# Altium footprint library LEMO THD.PcbLib: 54 footprints (part 2 of 4)
Each footprint in its own frame and in the unit in brackets; x right, y up, seen from the top. Pads: shape width x height; smd on the part's side, far side on the other; paste and mask are expansions set on the pad; w line width, h text height; cw(c..) or ccw(c..) is an arc to the next point about the centre after c.
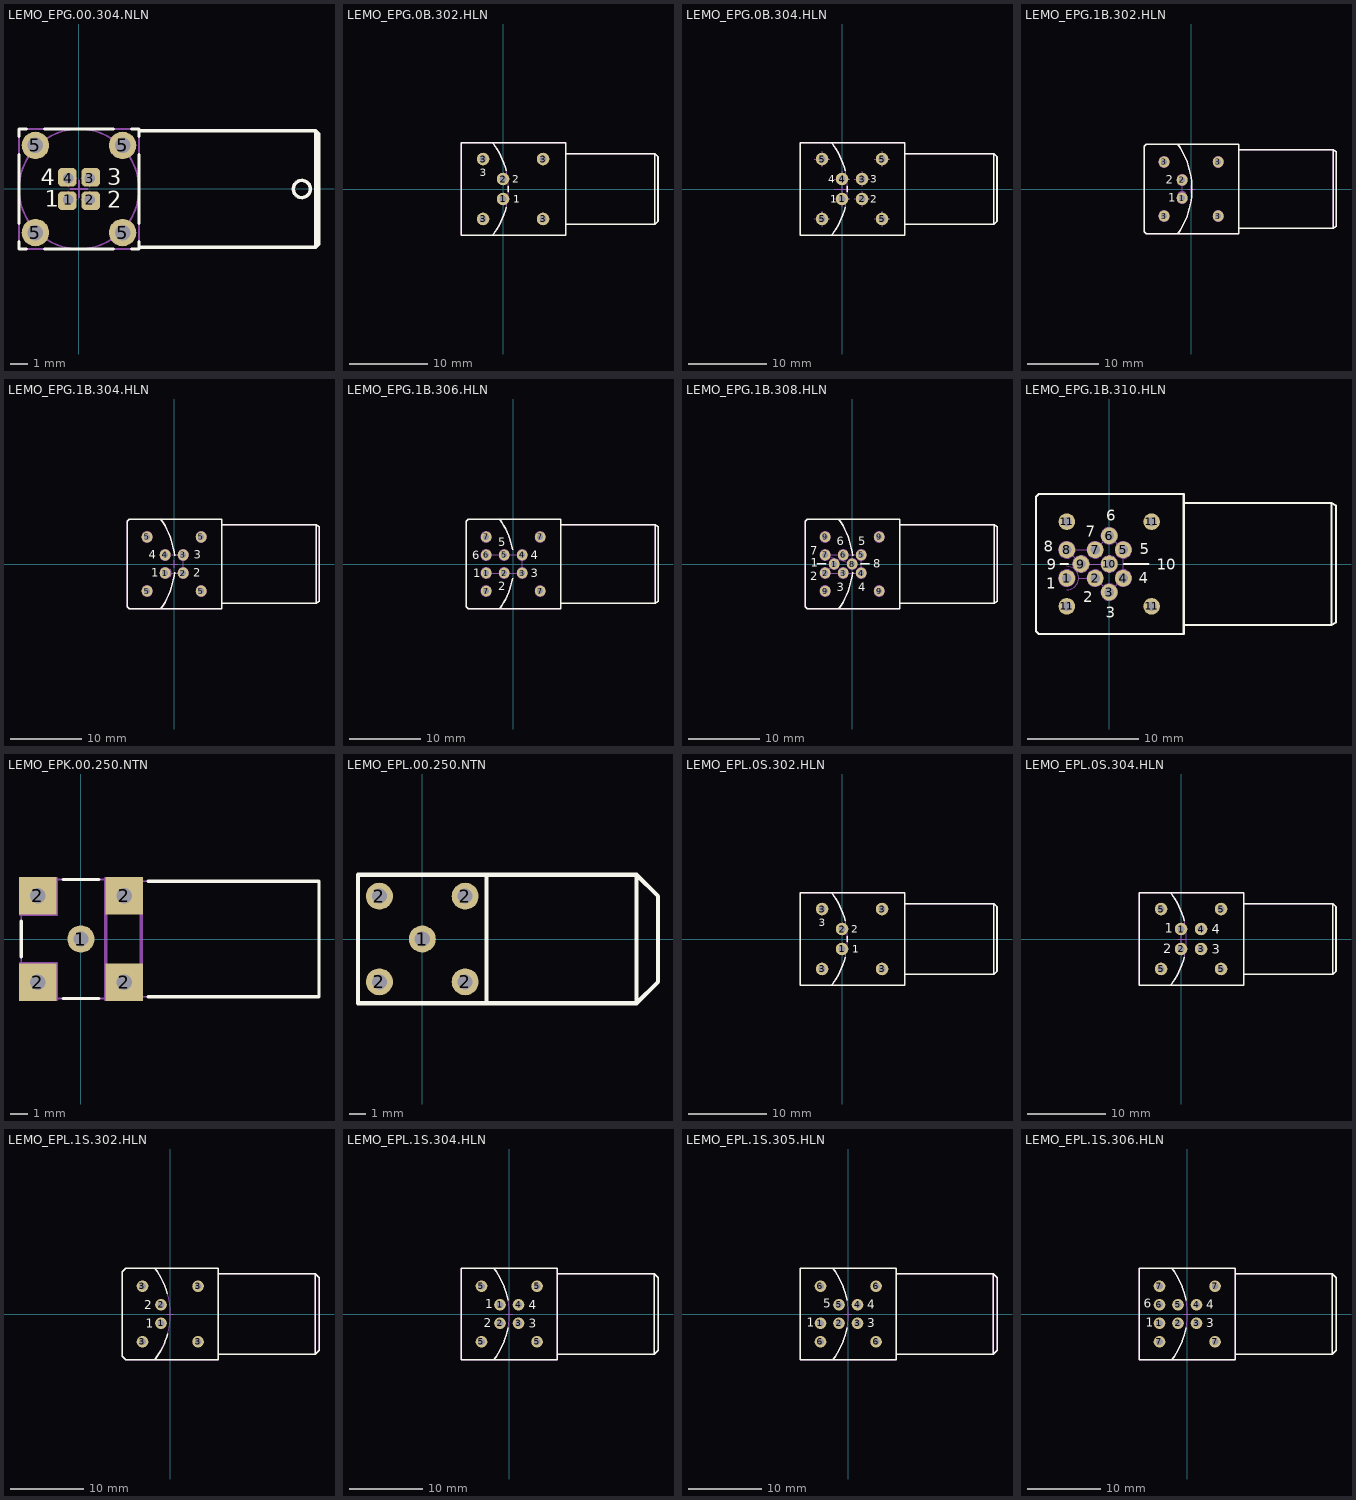
[diagram p1: the footprints below, top view; thin cyan lines are the x and y axes]

## LEMO_EPG.00.304.NLN [mm] "Multipole 4 Contacts, 50 Ohm size 00 Coaxial Elbow (90°) Socket With Key"
height 7
pads (8):
  rrect50% 1.1x1.1 hole 0.6 copper offset -0.05,-0.05: 1(-0.635,-0.635)
  rrect50% 1.1x1.1 hole 0.6 copper offset 0.05,-0.05: 2(0.635,-0.635)
  rrect50% 1.1x1.1 hole 0.6 copper offset 0.05,0.05: 3(0.635,0.635)
  rrect50% 1.1x1.1 hole 0.6 copper offset -0.05,0.05: 4(-0.635,0.635)
  round 1.6 hole 0.9: 5(-2.54,-2.54) 5(-2.54,2.54) 5(2.54,-2.54) 5(2.54,2.54)
Top Overlay:
  circle w0.2: c13,0 r0.5
  lines w0.2: -3.5,-3.077 -3.5,-3.5 -3.077,-3.5 ; -3.5,-2.003 -3.5,2.003 ; -3.5,3.077 -3.5,3.5 -3.077,3.5 ; -2.003,-3.5 2.003,-3.5 ; -2.003,3.5 2.003,3.5 ; 3.077,-3.5 3.5,-3.5 3.5,-3.077 ; 3.077,3.5 3.5,3.5 3.5,3.077 ; 3.5,-3.4 13.8,-3.4 ; 3.5,-2.003 3.5,2.003 ; 3.5,3.399 13.8,3.4 ; 13.8,-3.4 14,-3.2 14,3.2 13.8,3.4 ; 13.8,-3.4 13.8,3.4
  text "1" at -2.007,-1.048 h0.97
  text "4" at -2.231,0.232 h0.97
  text "3" at 1.652,0.208 h0.97
  text "2" at 1.648,-1.108 h0.97
Mechanical 8:
  lines w0.1: -3.04,-2.54 -2.54,-2.54 ; -3.04,2.54 -2.54,2.54 ; -2.54,-3.04 -2.54,-2.54 ; -2.54,-2.04 -2.54,-2.54 ; -2.54,2.04 -2.54,2.54 ; -2.54,3.04 -2.54,2.54 ; -2.04,-2.54 -2.54,-2.54 ; -2.04,2.54 -2.54,2.54 ; -1.135,-0.635 -0.635,-0.635 ; -1.135,0.635 -0.635,0.635 ; -0.635,-1.135 -0.635,-0.635 ; -0.635,-0.135 -0.635,-0.635 ; -0.635,0.135 -0.635,0.635 ; -0.635,1.135 -0.635,0.635 ; -0.5,0 0,0 ; -0.135,-0.635 -0.635,-0.635 ; -0.135,0.635 -0.635,0.635 ; 0,-0.5 0,0 ; 0,0.5 0,0 ; 0.135,-0.635 0.635,-0.635 ; 0.135,0.635 0.635,0.635 ; 0.5,0 0,0 ; 0.635,-1.135 0.635,-0.635 ; 0.635,-0.135 0.635,-0.635 ; 0.635,0.135 0.635,0.635 ; 0.635,1.135 0.635,0.635 ; 1.135,-0.635 0.635,-0.635 ; 1.135,0.635 0.635,0.635 ; 2.04,-2.54 2.54,-2.54 ; 2.04,2.54 2.54,2.54 ; 2.54,-3.04 2.54,-2.54 ; 2.54,-2.04 2.54,-2.54 ; 2.54,2.04 2.54,2.54 ; 2.54,3.04 2.54,2.54 ; 3.04,-2.54 2.54,-2.54 ; 3.04,2.54 2.54,2.54
Mechanical 14:
  circle w0.1: c0,0 r3.5
  circle w0.1: c13,0 r0.5
  lines w0.1: 3.5,-3.4 13.8,-3.4 ; 3.5,3.399 13.8,3.4 ; 13.8,-3.4 14,-3.2 14,3.2 13.8,3.4 ; 13.8,-3.4 13.8,3.4 ; -3.5,-3.5 3.5,-3.5 3.5,3.5 -3.5,3.5 -3.5,-3.5
  text "1" at -2.007,-1.048 h0.97
  text "4" at -2.231,0.232 h0.97
  text "3" at 1.652,0.208 h0.97
  text "2" at 1.648,-1.108 h0.97
3D body "LEMO_EPG.00.304.NLN.stp": height 7, standoff -3, extent -3.5,-3.5 14,3.5

## LEMO_EPG.0B.302.HLN [mm] "Elbow Receptacle (90°) With 2 Female Contacts and Key (G) For PCB"
height 12.7
pads (6):
  round 1.6 hole 0.9: 1(0,-1.27) 2(0,1.27) 3(-2.54,-3.81) 3(-2.54,3.81) 3(5.08,-3.81) 3(5.08,3.81)
Top Overlay:
  lines w0.2: -1.32,-5.85 ccw(c-8.876,0) 0.386,-2.353 ; -1.32,5.85 cw(c-8.876,0) 0.386,2.353 ; 0.674,-0.338 ccw(c-8.876,0) 0.674,0.338 ; 7.98,-4.5 19.28,-4.5 ; 7.98,4.5 19.28,4.5 ; 19.28,-4.5 19.68,-4.1 19.68,4.1 19.28,4.5 ; 19.28,-4.5 19.28,4.5 ; -5.32,-5.85 -5.32,5.85 7.98,5.85 7.98,-5.85 -5.32,-5.85
  text "3" at -2.975,1.625 h0.97
  text "2" at 1.186,0.787 h0.97
  text "1" at 1.275,-1.75 h0.97
Mechanical 14:
  circle w0.1: c0,1.27 r0.4
  circle w0.1: c0,-1.27 r0.4
  circle w0.1: c-2.54,-3.81 r0.4
  circle w0.1: c5.08,-3.81 r0.4
  circle w0.1: c5.08,3.81 r0.4
  circle w0.1: c-2.54,3.81 r0.4
  lines w0.1: -1.32,-5.85 ccw(c-8.876,0) -1.32,5.85 ; 7.98,-4.5 19.28,-4.5 ; 7.98,4.5 19.28,4.5 ; 19.28,-4.5 19.68,-4.1 19.68,4.1 19.28,4.5 ; 19.28,-4.5 19.28,4.5 ; -5.32,-5.85 -5.32,5.85 7.98,5.85 7.98,-5.85 -5.32,-5.85
  text "3" at -2.975,1.625 h0.97
  text "2" at 1.186,0.787 h0.97
  text "1" at 1.275,-1.75 h0.97
3D body "LEMO_EPG.0B.302.HLN.stp": height 12.7, standoff -4, extent -5.32,-5.85 19.68,5.85

## LEMO_EPG.0B.304.HLN [mm] "Elbow Receptacle (90°) With 4 Female Contacts and Key (G) For PCB"
height 12.7
pads (8):
  round 1.6 hole 0.9: 1(0,-1.27) 2(2.54,-1.27) 3(2.54,1.27) 4(0,1.27) 5(-2.54,-3.81) 5(-2.54,3.81) 5(5.08,-3.81) 5(5.08,3.81)
Top Overlay:
  lines w0.2: -1.32,-5.85 ccw(c-8.876,0) 0.386,-2.353 ; -1.32,5.85 cw(c-8.876,0) 0.386,2.353 ; 0.674,-0.338 ccw(c-8.876,0) 0.674,0.338 ; 7.98,-4.5 19.28,-4.5 ; 7.98,4.5 19.28,4.5 ; 19.28,-4.5 19.28,4.5 ; 19.28,-4.5 19.68,-4.1 19.68,4.1 19.28,4.5 ; -5.32,-5.85 7.98,-5.85 7.98,5.85 -5.32,5.85 -5.32,-5.85
  text "4" at -1.773,0.79 h0.97
  text "3" at 3.599,0.787 h0.97
  text "1" at -1.519,-1.75 h0.97
  text "2" at 3.599,-1.753 h0.97
Mechanical 8:
  lines w0.1: -3.54,-3.81 -2.54,-3.81 ; -3.54,3.81 -2.54,3.81 ; -2.54,-4.81 -2.54,-3.81 ; -2.54,-2.81 -2.54,-3.81 ; -2.54,2.81 -2.54,3.81 ; -2.54,4.81 -2.54,3.81 ; -1.54,-3.81 -2.54,-3.81 ; -1.54,3.81 -2.54,3.81 ; -1,-1.27 0,-1.27 ; -1,0 0,0 ; -1,1.27 0,1.27 ; 0,-2.27 0,-1.27 ; 0,-1 0,0 ; 0,-0.27 0,-1.27 ; 0,0.27 0,1.27 ; 0,1 0,0 ; 0,2.27 0,1.27 ; 1,-1.27 0,-1.27 ; 1,0 0,0 ; 1,1.27 0,1.27 ; 1.54,-1.27 2.54,-1.27 ; 1.54,1.27 2.54,1.27 ; 2.54,-2.27 2.54,-1.27 ; 2.54,-0.27 2.54,-1.27 ; 2.54,0.27 2.54,1.27 ; 2.54,2.27 2.54,1.27 ; 3.54,-1.27 2.54,-1.27 ; 3.54,1.27 2.54,1.27 ; 4.08,-3.81 5.08,-3.81 ; 4.08,3.81 5.08,3.81 ; 5.08,-4.81 5.08,-3.81 ; 5.08,-2.81 5.08,-3.81 ; 5.08,2.81 5.08,3.81 ; 5.08,4.81 5.08,3.81 ; 6.08,-3.81 5.08,-3.81 ; 6.08,3.81 5.08,3.81
Mechanical 14:
  circle w0.1: c-2.54,3.81 r0.4
  circle w0.1: c5.08,3.81 r0.4
  circle w0.1: c5.08,-3.81 r0.4
  circle w0.1: c-2.54,-3.81 r0.4
  circle w0.1: c0,-1.27 r0.4
  circle w0.1: c0,1.27 r0.4
  circle w0.1: c2.54,1.27 r0.4
  circle w0.1: c2.54,-1.27 r0.4
  lines w0.1: -1.32,-5.85 ccw(c-8.876,0) -1.32,5.85 ; 7.98,-4.5 19.28,-4.5 ; 7.98,4.5 19.28,4.5 ; 19.28,-4.5 19.28,4.5 ; 19.28,-4.5 19.68,-4.1 19.68,4.1 19.28,4.5 ; -5.32,-5.85 7.98,-5.85 7.98,5.85 -5.32,5.85 -5.32,-5.85
  text "4" at -1.773,0.79 h0.97
  text "3" at 3.599,0.787 h0.97
  text "1" at -1.519,-1.75 h0.97
  text "2" at 3.599,-1.753 h0.97
3D body "LEMO_EPG.0B.304.HLN.stp": height 12.7, standoff -4, extent -5.32,-5.85 19.68,5.85

## LEMO_EPG.1B.302.HLN [mm] "Elbow Receptacle (90°) With 2 Female Contacts and Key For PCB"
height 14
pads (6):
  round 1.55 hole 0.85: 1(-1.27,-1.27) 2(-1.27,1.27) 3(-3.81,-3.81) 3(-3.81,3.81) 3(3.81,-3.81) 3(3.81,3.81)
Top Overlay:
  lines w0.2: -1.875,-6.3 ccw(c-10.879,0) -1.875,6.3 ; 6.71,-5.5 20.01,-5.5 ; 6.71,5.5 20.01,5.5 ; 20.01,-5.5 20.41,-5.26 20.41,5.26 20.01,5.5 ; 20.01,-5.5 20.01,5.5 ; -6.59,-6.05 -6.59,6.05 -6.34,6.3 6.71,6.3 6.71,-6.3 -6.34,-6.3 -6.59,-6.05
  text "1" at -3.237,-1.788 h1.2
  text "2" at -3.577,0.712 h1.2
Mechanical 8:
  circle w0.1: c3.81,3.81 r0.75
  circle w0.1: c3.81,-3.81 r0.75
  circle w0.1: c-3.81,-3.81 r0.75
  circle w0.1: c-1.27,-1.27 r0.75
  circle w0.1: c-1.27,1.27 r0.75
  circle w0.1: c-3.81,3.81 r0.75
  lines w0.1: -4.31,-3.81 -3.81,-3.81 ; -4.31,3.81 -3.81,3.81 ; -3.81,-4.31 -3.81,-3.81 ; -3.81,-3.31 -3.81,-3.81 ; -3.81,3.31 -3.81,3.81 ; -3.81,4.31 -3.81,3.81 ; -3.31,-3.81 -3.81,-3.81 ; -3.31,3.81 -3.81,3.81 ; -1.77,-1.27 -1.27,-1.27 ; -1.77,1.27 -1.27,1.27 ; -1.27,-1.77 -1.27,-1.27 ; -1.27,-0.77 -1.27,-1.27 ; -1.27,0.77 -1.27,1.27 ; -1.27,1.77 -1.27,1.27 ; -0.77,-1.27 -1.27,-1.27 ; -0.77,1.27 -1.27,1.27 ; -0.5,0 0,0 ; 0,-0.5 0,0 ; 0,0.5 0,0 ; 0.5,0 0,0 ; 3.31,-3.81 3.81,-3.81 ; 3.31,3.81 3.81,3.81 ; 3.81,-4.31 3.81,-3.81 ; 3.81,-3.31 3.81,-3.81 ; 3.81,3.31 3.81,3.81 ; 3.81,4.31 3.81,3.81 ; 4.31,-3.81 3.81,-3.81 ; 4.31,3.81 3.81,3.81
Mechanical 14:
  lines w0.1: -1.875,-6.3 ccw(c-10.879,0) -1.875,6.3 ; -1.8,-0.591 cw(c-1.27,-1.121) -0.74,-0.591 ; -1.27,-0.371 -1.27,0.52 ; 6.71,-5.5 20.01,-5.5 ; 6.71,5.5 20.01,5.5 ; 20.01,-5.5 20.41,-5.26 20.41,5.26 20.01,5.5 ; 20.01,-5.5 20.01,5.5 ; -6.59,-6.05 -6.59,6.05 -6.34,6.3 6.71,6.3 6.71,-6.3 -6.34,-6.3 -6.59,-6.05
  text "1" at -3.237,-1.788 h1.2
  text "2" at -3.577,0.712 h1.2
3D body "LEMO_EPG.1B.302.HLN.stp": height 14, standoff -3.2, extent -6.59,-6.3 20.41,6.3

## LEMO_EPG.1B.304.HLN [mm] "Elbow Receptacle (90°) With 4 Female Contacts and Key For PCB"
height 14
pads (8):
  round 1.55 hole 0.85: 1(-1.27,-1.27) 2(1.27,-1.27) 3(1.27,1.27) 4(-1.27,1.27) 5(-3.81,-3.81) 5(-3.81,3.81) 5(3.81,-3.81) 5(3.81,3.81)
Top Overlay:
  lines w0.2: -1.875,-6.3 ccw(c-10.879,0) 0.05,-1.149 ; -1.875,6.3 cw(c-10.879,0) 0.05,1.149 ; 6.71,-5.5 20.01,-5.5 ; 6.71,5.5 20.01,5.5 ; 20.01,-5.5 20.01,5.5 ; 20.01,-5.5 20.41,-5.26 20.41,5.26 20.01,5.5 ; -6.59,-6.05 -6.34,-6.3 6.71,-6.3 6.71,6.3 -6.34,6.3 -6.59,6.05 -6.59,-6.05
  text "4" at -3.577,0.712 h1.2
  text "3" at 2.783,0.712 h1.2
  text "2" at 2.688,-1.788 h1.2
  text "1" at -3.237,-1.788 h1.2
Mechanical 8:
  circle w0.1: c-3.81,3.81 r0.75
  circle w0.1: c-1.27,1.27 r0.75
  circle w0.1: c1.27,1.27 r0.75
  circle w0.1: c1.27,-1.27 r0.75
  circle w0.1: c-1.27,-1.27 r0.75
  circle w0.1: c-3.81,-3.81 r0.75
  circle w0.1: c3.81,-3.81 r0.75
  circle w0.1: c3.81,3.81 r0.75
  lines w0.1: -4.31,-3.81 -3.81,-3.81 ; -4.31,3.81 -3.81,3.81 ; -3.81,-4.31 -3.81,-3.81 ; -3.81,-3.31 -3.81,-3.81 ; -3.81,3.31 -3.81,3.81 ; -3.81,4.31 -3.81,3.81 ; -3.31,-3.81 -3.81,-3.81 ; -3.31,3.81 -3.81,3.81 ; -1.77,-1.27 -1.27,-1.27 ; -1.77,1.27 -1.27,1.27 ; -1.27,-1.77 -1.27,-1.27 ; -1.27,-0.77 -1.27,-1.27 ; -1.27,0.77 -1.27,1.27 ; -1.27,1.77 -1.27,1.27 ; -0.77,-1.27 -1.27,-1.27 ; -0.77,1.27 -1.27,1.27 ; -0.5,0 0,0 ; 0,-0.5 0,0 ; 0,0.5 0,0 ; 0.5,0 0,0 ; 0.77,-1.27 1.27,-1.27 ; 0.77,1.27 1.27,1.27 ; 1.27,-1.77 1.27,-1.27 ; 1.27,-0.77 1.27,-1.27 ; 1.27,0.77 1.27,1.27 ; 1.27,1.77 1.27,1.27 ; 1.77,-1.27 1.27,-1.27 ; 1.77,1.27 1.27,1.27 ; 3.31,-3.81 3.81,-3.81 ; 3.31,3.81 3.81,3.81 ; 3.81,-4.31 3.81,-3.81 ; 3.81,-3.31 3.81,-3.81 ; 3.81,3.31 3.81,3.81 ; 3.81,4.31 3.81,3.81 ; 4.31,-3.81 3.81,-3.81 ; 4.31,3.81 3.81,3.81
Mechanical 14:
  lines w0.1: -1.875,-6.3 ccw(c-10.879,0) -0.033,-1.77 ; -1.875,6.3 cw(c-10.879,0) -0.033,1.77 ; -0.591,-1.8 ccw(c-1.121,-1.27) -0.591,-0.74 ; -0.371,-1.27 0.52,-1.27 ; -0.371,1.27 0.52,1.27 ; 1.27,-0.52 1.27,0.52 ; 6.71,-5.5 20.01,-5.5 ; 6.71,5.5 20.01,5.5 ; 20.01,-5.5 20.01,5.5 ; 20.01,-5.5 20.41,-5.26 20.41,5.26 20.01,5.5 ; -6.59,-6.05 -6.34,-6.3 6.71,-6.3 6.71,6.3 -6.34,6.3 -6.59,6.05 -6.59,-6.05
  text "4" at -3.577,0.712 h1.2
  text "3" at 2.783,0.712 h1.2
  text "2" at 2.688,-1.788 h1.2
  text "1" at -3.237,-1.788 h1.2
3D body "LEMO_EPG.1B.304.HLN.stp": height 14, standoff -3.2, extent -6.59,-6.3 20.41,6.3

## LEMO_EPG.1B.306.HLN [mm] "Elbow Receptacle (90°) With 6 Female Contacts and Key For PCB"
height 14
pads (10):
  round 1.5 hole 0.85: 1(-3.81,-1.27) 2(-1.27,-1.27) 3(1.27,-1.27) 4(1.27,1.27) 5(-1.27,1.27) 6(-3.81,1.27) 7(-3.81,-3.81) 7(-3.81,3.81) 7(3.81,-3.81) 7(3.81,3.81)
Top Overlay:
  lines w0.2: -1.875,-6.3 ccw(c-10.879,0) -0.077,-2.02 ; -1.875,6.3 cw(c-10.879,0) -0.077,2.02 ; 6.71,-5.5 20.01,-5.5 ; 6.71,5.5 20.01,5.5 ; 20.01,-5.5 20.01,5.5 ; 20.01,-5.5 20.41,-5.26 20.41,5.26 20.01,5.5 ; -6.59,-6.05 -6.34,-6.3 6.71,-6.3 6.71,6.3 -6.34,6.3 -6.59,6.05 -6.59,-6.05
  text "4" at 2.5,0.67 h1.2
  text "5" at -2.1,2.5 h1.2
  text "6" at -5.8,0.67 h1.2
  text "3" at 2.5,-1.87 h1.2
  text "2" at -2.1,-3.7 h1.2
  text "1" at -5.6,-1.87 h1.2
Mechanical 8:
  circle w0.1: c-3.81,3.81 r0.75
  circle w0.1: c-1.27,1.27 r0.75
  circle w0.1: c1.27,1.27 r0.75
  circle w0.1: c1.27,-1.27 r0.75
  circle w0.1: c-1.27,-1.27 r0.75
  circle w0.1: c-3.81,-1.27 r0.75
  circle w0.1: c-3.81,1.27 r0.75
  circle w0.1: c-3.81,-3.81 r0.75
  circle w0.1: c3.81,-3.81 r0.75
  circle w0.1: c3.81,3.81 r0.75
  lines w0.1: -4.31,-3.81 -3.81,-3.81 ; -4.31,-1.27 -3.81,-1.27 -3.81,-0.77 ; -4.31,1.27 -3.81,1.27 ; -4.31,3.81 -3.81,3.81 ; -3.81,-4.31 -3.81,-3.81 ; -3.81,-3.31 -3.81,-3.81 ; -3.81,0.77 -3.81,1.27 ; -3.81,1.77 -3.81,1.27 ; -3.81,3.31 -3.81,3.81 ; -3.81,4.31 -3.81,3.81 ; -3.31,-3.81 -3.81,-3.81 ; -3.31,1.27 -3.81,1.27 ; -3.31,3.81 -3.81,3.81 ; -1.77,-1.27 -1.27,-1.27 ; -1.77,1.27 -1.27,1.27 ; -1.27,-1.77 -1.27,-1.27 ; -1.27,-0.77 -1.27,-1.27 ; -1.27,0.77 -1.27,1.27 ; -1.27,1.77 -1.27,1.27 ; -0.77,-1.27 -1.27,-1.27 ; -0.77,1.27 -1.27,1.27 ; 0.77,-1.27 1.27,-1.27 ; 0.77,1.27 1.27,1.27 ; 1.27,-1.77 1.27,-1.27 ; 1.27,-0.77 1.27,-1.27 ; 1.27,0.77 1.27,1.27 ; 1.27,1.77 1.27,1.27 ; 1.77,-1.27 1.27,-1.27 ; 1.77,1.27 1.27,1.27 ; 3.31,-3.81 3.81,-3.81 ; 3.31,3.81 3.81,3.81 ; 3.81,-4.31 3.81,-3.81 ; 3.81,-3.31 3.81,-3.81 ; 3.81,3.31 3.81,3.81 ; 3.81,4.31 3.81,3.81 ; 4.31,-3.81 3.81,-3.81 ; 4.31,3.81 3.81,3.81
Mechanical 14:
  lines w0.1: -3.06,-1.27 -2.02,-1.27 ; -3.06,1.27 -2.02,1.27 ; -1.875,-6.3 ccw(c-10.879,0) -0.077,-2.02 ; -1.875,6.3 cw(c-10.879,0) -0.077,2.02 ; -0.52,-1.27 0.52,-1.27 ; -0.52,1.27 0.52,1.27 ; 1.27,-0.52 1.27,0.52 ; 6.71,-5.5 20.01,-5.5 ; 6.71,5.5 20.01,5.5 ; 20.01,-5.5 20.01,5.5 ; 20.01,-5.5 20.41,-5.26 20.41,5.26 20.01,5.5 ; -6.59,-6.05 -6.34,-6.3 6.71,-6.3 6.71,6.3 -6.34,6.3 -6.59,6.05 -6.59,-6.05
  text "4" at 2.5,0.67 h1.2
  text "5" at -2.1,2.5 h1.2
  text "6" at -5.8,0.67 h1.2
  text "3" at 2.5,-1.87 h1.2
  text "2" at -2.1,-3.7 h1.2
  text "1" at -5.6,-1.87 h1.2
3D body "LEMO_EPG.1B.306.HLN.stp": height 14, standoff -3.2, extent -6.59,-6.3 20.41,6.3

## LEMO_EPG.1B.308.HLN [mm] "Elbow Receptacle (90°) With 8 Female Contacts and Key For PCB"
height 14
pads (12):
  round 1.5 hole 0.85: 1(-2.54,0) 2(-3.81,-1.27) 3(-1.27,-1.27) 4(1.27,-1.27) 5(1.27,1.27) 6(-1.27,1.27) 7(-3.81,1.27) 8(0,0) 9(-3.81,-3.81) 9(-3.81,3.81) 9(3.81,-3.81) 9(3.81,3.81)
Top Overlay:
  lines w0.2: -1.875,-6.3 ccw(c-10.879,0) 0.05,-1.149 ; -1.875,6.3 cw(c-10.879,0) 0.05,1.149 ; 6.71,-5.5 20.01,-5.5 ; 6.71,5.5 20.01,5.5 ; 20.01,-5.5 20.41,-5.26 20.41,5.26 20.01,5.5 ; 20.01,-5.5 20.01,5.5 ; -6.59,-6.05 -6.59,6.05 -6.34,6.3 6.71,6.3 6.71,-6.3 -6.34,-6.3 -6.59,-6.05
  lines w0.254: -4.9,0.025 -3.775,0.025 ; 1.25,0.025 2.375,0.025
  text "1" at -5.862,-0.413 h1.2
  text "2" at -5.887,-2.288 h1.2
  text "7" at -5.937,1.277 h1.2
  text "8" at 2.938,-0.513 h1.2
  text "3" at -2.192,-3.863 h1.2
  text "6" at -2.192,2.662 h1.2
  text "5" at 0.873,2.662 h1.2
  text "4" at 0.873,-3.863 h1.2
Mechanical 8:
  circle w0.1: c3.81,3.81 r0.75
  circle w0.1: c3.81,-3.81 r0.75
  circle w0.1: c-3.81,-3.81 r0.75
  circle w0.1: c-3.81,1.27 r0.75
  circle w0.1: c-3.81,-1.27 r0.75
  circle w0.1: c-1.27,-1.27 r0.75
  circle w0.1: c1.27,-1.27 r0.75
  circle w0.1: c1.27,1.27 r0.75
  circle w0.1: c0,0 r0.75
  circle w0.1: c-2.54,0 r0.75
  circle w0.1: c-1.27,1.27 r0.75
  circle w0.1: c-3.81,3.81 r0.75
  lines w0.1: -4.31,-3.81 -3.81,-3.81 ; -4.31,-1.27 -3.81,-1.27 ; -4.31,1.27 -3.81,1.27 ; -4.31,3.81 -3.81,3.81 ; -3.81,-4.31 -3.81,-3.81 ; -3.81,-3.31 -3.81,-3.81 ; -3.81,-1.77 -3.81,-1.27 ; -3.81,-0.77 -3.81,-1.27 ; -3.81,0.77 -3.81,1.27 ; -3.81,1.77 -3.81,1.27 ; -3.81,3.31 -3.81,3.81 ; -3.81,4.31 -3.81,3.81 ; -3.31,-3.81 -3.81,-3.81 ; -3.31,-1.27 -3.81,-1.27 ; -3.31,1.27 -3.81,1.27 ; -3.31,3.81 -3.81,3.81 ; -3.04,0 -2.54,0 ; -2.54,-0.5 -2.54,0 ; -2.54,0.5 -2.54,0 ; -2.04,0 -2.54,0 ; -1.77,-1.27 -1.27,-1.27 ; -1.77,1.27 -1.27,1.27 ; -1.27,-1.77 -1.27,-1.27 ; -1.27,-0.77 -1.27,-1.27 ; -1.27,0.77 -1.27,1.27 ; -1.27,1.77 -1.27,1.27 ; -0.77,-1.27 -1.27,-1.27 ; -0.77,1.27 -1.27,1.27 ; -0.5,0 0,0 ; 0,-0.5 0,0 ; 0,0.5 0,0 ; 0.5,0 0,0 ; 0.77,-1.27 1.27,-1.27 ; 0.77,1.27 1.27,1.27 ; 1.27,-1.77 1.27,-1.27 ; 1.27,-0.77 1.27,-1.27 ; 1.27,0.77 1.27,1.27 ; 1.27,1.77 1.27,1.27 ; 1.77,-1.27 1.27,-1.27 ; 1.77,1.27 1.27,1.27 ; 3.31,-3.81 3.81,-3.81 ; 3.31,3.81 3.81,3.81 ; 3.81,-4.31 3.81,-3.81 ; 3.81,-3.31 3.81,-3.81 ; 3.81,3.31 3.81,3.81 ; 3.81,4.31 3.81,3.81 ; 4.31,-3.81 3.81,-3.81 ; 4.31,3.81 3.81,3.81
Mechanical 14:
  lines w0.1: -3.29,0 ccw(c-2.54,0) -2.54,-0.75 ; -3.28,-0.74 -3.07,-0.53 ; -3.098,1.033 -0.712,0.237 ; -3.06,-1.27 -2.02,-1.27 ; -3.06,1.27 -2.02,1.27 ; -1.875,-6.3 ccw(c-10.879,0) -0.033,-1.77 ; -1.875,6.3 cw(c-10.879,0) -0.033,1.77 ; -0.52,-1.27 0.52,-1.27 ; -0.52,1.27 0.52,1.27 ; 1.27,-0.52 1.27,0.52 ; 6.71,-5.5 20.01,-5.5 ; 6.71,5.5 20.01,5.5 ; 20.01,-5.5 20.41,-5.26 20.41,5.26 20.01,5.5 ; 20.01,-5.5 20.01,5.5 ; -6.59,-6.05 -6.59,6.05 -6.34,6.3 6.71,6.3 6.71,-6.3 -6.34,-6.3 -6.59,-6.05
  text "1" at -5.862,-0.413 h1.2
  text "2" at -5.887,-2.288 h1.2
  text "7" at -5.937,1.277 h1.2
  text "8" at 2.938,-0.513 h1.2
  text "3" at -2.192,-3.863 h1.2
  text "6" at -2.192,2.662 h1.2
  text "5" at 0.873,2.662 h1.2
  text "4" at 0.873,-3.863 h1.2
3D body "LEMO_EPG.1B.308.HLN.stp": height 14, standoff -3.2, extent -6.59,-6.3 20.41,6.3

## LEMO_EPG.1B.310.HLN [mm] "Elbow Receptacle (90°) With 10 Female Contacts and Key For PCB"
height 14
pads (14):
  round 1.5 hole 0.85: 1(-3.81,-1.27) 2(-1.27,-1.27) 3(0,-2.54) 4(1.27,-1.27) 5(1.27,1.27) 6(0,2.54) 7(-1.27,1.27) 8(-3.81,1.27) 9(-2.54,0) 10(0,0) 11(-3.81,-3.81) 11(-3.81,3.81) 11(3.81,-3.81) 11(3.81,3.81)
Top Overlay:
  lines w0.2: -4.375,0 -3.725,0 ; 1.35,0 3.525,0 ; 6.71,5.5 20.01,5.5 ; 20.01,-5.5 20.41,-5.26 20.41,5.26 20.01,5.5 ; 20.01,-5.5 6.71,-5.5 20.01,-5.5 ; 20.01,-5.5 20.01,5.5 ; -6.59,-6.05 -6.34,-6.3 6.71,-6.3 6.71,6.3 -6.34,6.3 -6.59,6.05 -6.59,-6.05
  text "10" at 4.3,-0.5 h1
  text "9" at -5.6,-0.525 h1
  text "8" at -5.9,1.1 h1
  text "7" at -2.1,2.475 h1
  text "6" at -0.275,3.875 h1
  text "5" at 2.75,0.875 h1
  text "4" at 2.65,-1.75 h1
  text "3" at -0.3,-4.85 h1
  text "2" at -2.325,-3.425 h1
  text "1" at -5.675,-2.225 h1
Mechanical 8:
  lines w0.1: -4.31,-3.81 -3.81,-3.81 ; -4.31,-1.27 -3.81,-1.27 ; -4.31,1.27 -3.81,1.27 ; -4.31,3.81 -3.81,3.81 ; -3.81,-4.31 -3.81,-3.81 ; -3.81,-3.31 -3.81,-3.81 ; -3.81,-1.77 -3.81,-1.27 ; -3.81,-0.77 -3.81,-1.27 ; -3.81,0.77 -3.81,1.27 ; -3.81,1.77 -3.81,1.27 ; -3.81,3.31 -3.81,3.81 ; -3.81,4.31 -3.81,3.81 ; -3.31,-3.81 -3.81,-3.81 ; -3.31,-1.27 -3.81,-1.27 ; -3.31,1.27 -3.81,1.27 ; -3.31,3.81 -3.81,3.81 ; -3.04,0 -2.54,0 ; -2.54,-0.5 -2.54,0 ; -2.54,0.5 -2.54,0 ; -2.04,0 -2.54,0 ; -1.77,-1.27 -1.27,-1.27 ; -1.77,1.27 -1.27,1.27 ; -1.27,-1.77 -1.27,-1.27 ; -1.27,-0.77 -1.27,-1.27 ; -1.27,0.77 -1.27,1.27 ; -1.27,1.77 -1.27,1.27 ; -0.77,-1.27 -1.27,-1.27 ; -0.77,1.27 -1.27,1.27 ; -0.5,-2.54 0,-2.54 ; -0.5,0 0,0 ; -0.5,2.54 0,2.54 ; 0,-3.04 0,-2.54 ; 0,-2.04 0,-2.54 ; 0,-0.5 0,0 ; 0,0.5 0,0 ; 0,2.04 0,2.54 ; 0,3.04 0,2.54 ; 0.5,-2.54 0,-2.54 ; 0.5,0 0,0 ; 0.5,2.54 0,2.54 ; 0.77,-1.27 1.27,-1.27 ; 0.77,1.27 1.27,1.27 ; 1.27,-1.77 1.27,-1.27 ; 1.27,-0.77 1.27,-1.27 ; 1.27,0.77 1.27,1.27 ; 1.27,1.77 1.27,1.27 ; 1.77,-1.27 1.27,-1.27 ; 1.77,1.27 1.27,1.27 ; 3.31,-3.81 3.81,-3.81 ; 3.31,3.81 3.81,3.81 ; 3.81,-4.31 3.81,-3.81 ; 3.81,-3.31 3.81,-3.81 ; 3.81,3.31 3.81,3.81 ; 3.81,4.31 3.81,3.81 ; 4.31,-3.81 3.81,-3.81 ; 4.31,3.81 3.81,3.81
Mechanical 14:
  circle w0.1: c-3.81,-1.27 r0.75
  circle w0.1: c-3.81,1.27 r0.75
  circle w0.1: c-1.27,1.27 r0.75
  circle w0.1: c-2.54,0 r0.75
  circle w0.1: c-1.27,-1.27 r0.75
  circle w0.1: c0,-2.54 r0.75
  circle w0.1: c1.27,-1.27 r0.75
  circle w0.1: c0,0 r0.75
  circle w0.1: c1.27,1.27 r0.75
  circle w0.1: c0,2.54 r0.75
  lines w0.1: -3.81,-2.32 ccw(c-3.81,-1.27) -3.81,-0.22 ; -3.28,0.74 -3.07,0.53 ; -3.06,1.27 -2.02,1.27 ; -2.76,-1.27 -2.02,-1.27 ; -1.79,0 -0.75,0 ; -0.74,-1.8 -0.53,-2.01 ; -0.74,1.8 -0.53,2.01 ; 0.53,-2.01 0.74,-1.8 ; 0.53,2.01 0.74,1.8 ; 1.27,-0.52 1.27,0.52 ; 6.71,5.5 20.01,5.5 ; 20.01,-5.5 20.41,-5.26 20.41,5.26 20.01,5.5 ; 20.01,-5.5 6.71,-5.5 20.01,-5.5 ; 20.01,-5.5 20.01,5.5 ; -6.59,-6.05 -6.34,-6.3 6.71,-6.3 6.71,6.3 -6.34,6.3 -6.59,6.05 -6.59,-6.05
  text "1" at -3.925,-1.65 h0.8
  text "2" at -1.55,-1.625 h0.8
  text "3" at -0.275,-2.95 h0.8
  text "4" at 0.975,-1.675 h0.8
  text "5" at 1,0.9 h0.8
  text "6" at -0.3,2.125 h0.8
  text "7" at -1.525,0.875 h0.8
  text "8" at -4.075,0.85 h0.8
  text "9" at -2.825,-0.4 h0.8
  text "10" at -0.6,-0.4 h0.8
3D body "LEMO_EPG.1B.310.HLN.stp": height 14, standoff -3.2, extent -6.59,-6.3 20.41,6.3

## LEMO_EPK.00.250.NTN [mm] "50 Ohm size 00 Coaxial Elbow (90°) socket"
height 7
pads (5):
  round 1.6 hole 0.9: 1(0,0)
  rect 2.2x2.2 / inner round 1.6 / far side round 1.6 hole 0.9: 2(-2.54,-2.54) 2(-2.54,2.54) 2(2.54,-2.54) 2(2.54,2.54)
Top Overlay:
  lines w0.2: -3.5,-1.05 -3.5,1.05 ; -1.05,-3.5 1.05,-3.5 ; -1.05,3.5 1.05,3.5 ; 3.95,-3.4 14,-3.4 14,3.4 3.95,3.4
Mechanical 8:
  lines w0.1: -3.04,-2.54 -2.54,-2.54 ; -3.04,2.54 -2.54,2.54 ; -2.54,-3.04 -2.54,-2.54 ; -2.54,-2.04 -2.54,-2.54 ; -2.54,2.04 -2.54,2.54 ; -2.54,3.04 -2.54,2.54 ; -2.04,-2.54 -2.54,-2.54 ; -2.04,2.54 -2.54,2.54 ; -0.5,0 0,0 ; 0,-0.5 0,0 ; 0,0.5 0,0 ; 0.5,0 0,0 ; 2.04,-2.54 2.54,-2.54 ; 2.04,2.54 2.54,2.54 ; 2.54,-3.04 2.54,-2.54 ; 2.54,-2.04 2.54,-2.54 ; 2.54,2.04 2.54,2.54 ; 2.54,3.04 2.54,2.54 ; 3.04,-2.54 2.54,-2.54 ; 3.04,2.54 2.54,2.54 ; -3.6,-3.6 -1.4,-3.6 -1.4,-1.4 -3.6,-1.4 -3.6,-3.6 ; -3.6,1.4 -1.4,1.4 -1.4,3.6 -3.6,3.6 -3.6,1.4 ; -3.5,-3.5 -1.5,-3.5 -1.5,-1.5 -3.5,-1.5 -3.5,-3.5 ; -3.5,1.5 -1.5,1.5 -1.5,3.5 -3.5,3.5 -3.5,1.5 ; 1.4,-3.6 3.6,-3.6 3.6,3.6 1.4,3.6 1.4,-3.6 ; 1.5,-3.5 3.5,-3.5 3.5,3.5 1.5,3.5 1.5,-3.5
Mechanical 14:
  lines w0.1: 1.5,-3.5 3.5,-3.5 ; 3.5,-3.4 14,-3.4 14,3.4 3.5,3.4 ; 3.5,-3.5 3.5,3.5 ; 3.5,-3.5 -3.5,-3.5 -3.5,3.5 3.5,3.5 ; 3.5,-3.5 3.5,3.5
3D body "LEMO_EPK.00.250.NTN.stp": height 7, standoff -3, extent -3.5,-3.5 14,3.5

## LEMO_EPL.00.250.NTN [mm] "50 Ohm size 00 Coaxial Elbow (90°) socket"
height 7
pads (5):
  round 1.6 hole 0.9: 1(0,0) 2(-2.54,-2.54) 2(-2.54,2.54) 2(2.54,-2.54) 2(2.54,2.54)
Top Overlay:
  lines w0.254: 3.81,-3.81 12.7,-3.81 ; 3.81,-3.81 3.81,3.81 ; 3.81,-3.81 -3.81,-3.81 -3.81,3.81 3.81,3.81 ; 3.81,3.81 12.7,3.81 ; 12.7,-3.81 13.97,-2.54 13.97,2.54 12.7,3.81 ; 12.7,-3.81 12.7,3.81
Mechanical 14:
  lines w0.1: 3.81,-3.81 3.81,3.81 ; 3.81,-3.81 -3.81,-3.81 -3.81,3.81 3.81,3.81 ; 3.81,-3.81 12.7,-3.81 ; 3.81,3.81 12.7,3.81 ; 12.7,-3.81 13.97,-2.54 13.97,2.54 12.7,3.81 ; 12.7,-3.81 12.7,3.81
3D body "LEMO_EPL.00.250.NTN.stp": height 7, standoff -3, extent -3.5,-3.5 14,3.5

## LEMO_EPL.0S.302.HLN [mm] "Elbow Receptacle (90°) With 1 Female + 1 Male Contacts and Hermaphroditic Keying"
height 12.7
pads (6):
  round 1.6 hole 0.9: 1(0,-1.27) 2(0,1.27) 3(-2.54,-3.81) 3(-2.54,3.81) 3(5.08,-3.81) 3(5.08,3.81)
Top Overlay:
  lines w0.2: -1.32,-5.85 ccw(c-8.876,0) 0.386,-2.353 ; -1.32,5.85 cw(c-8.876,0) 0.386,2.353 ; 0.674,-0.338 ccw(c-8.876,0) 0.674,0.338 ; 7.98,-4.5 19.28,-4.5 ; 7.98,4.5 19.28,4.5 ; 19.28,-4.5 19.28,4.5 ; 19.28,-4.5 19.68,-4.1 19.68,4.1 19.28,4.5 ; -5.32,-5.85 7.98,-5.85 7.98,5.85 -5.32,5.85 -5.32,-5.85
  text "1" at 1.275,-1.75 h0.97
  text "2" at 1.186,0.787 h0.97
  text "3" at -2.975,1.625 h0.97
Mechanical 14:
  circle w0.1: c-2.54,3.81 r0.4
  circle w0.1: c5.08,3.81 r0.4
  circle w0.1: c5.08,-3.81 r0.4
  circle w0.1: c-2.54,-3.81 r0.4
  circle w0.1: c0,-1.27 r0.4
  circle w0.1: c0,1.27 r0.4
  lines w0.1: -1.32,-5.85 ccw(c-8.876,0) -1.32,5.85 ; 7.98,-4.5 19.28,-4.5 ; 7.98,4.5 19.28,4.5 ; 19.28,-4.5 19.28,4.5 ; 19.28,-4.5 19.68,-4.1 19.68,4.1 19.28,4.5 ; -5.32,-5.85 7.98,-5.85 7.98,5.85 -5.32,5.85 -5.32,-5.85
  text "1" at 1.275,-1.75 h0.97
  text "2" at 1.186,0.787 h0.97
  text "3" at -2.975,1.625 h0.97
3D body "LEMO_EPL.0S.302.HLN.stp": height 12.7, standoff -4, extent -5.32,-5.85 19.68,5.85

## LEMO_EPL.0S.304.HLN [mm] "Elbow Receptacle (90°) With 2 Female + 2 Male Contacts and Hermaphroditic Keying"
height 12.7
pads (8):
  round 1.6 hole 0.9: 1(0,1.27) 2(0,-1.27) 3(2.54,-1.27) 4(2.54,1.27) 5(-2.54,-3.81) 5(-2.54,3.81) 5(5.08,-3.81) 5(5.08,3.81)
Top Overlay:
  lines w0.2: -1.32,-5.85 ccw(c-8.876,0) 0.386,-2.353 ; -1.32,5.85 cw(c-8.876,0) 0.386,2.353 ; 7.98,-4.5 19.28,-4.5 ; 7.98,4.5 19.28,4.5 ; 19.28,-4.5 19.68,-4.1 19.68,4.1 19.28,4.5 ; 19.28,-4.5 19.28,4.5 ; -5.32,-5.85 -5.32,5.85 7.98,5.85 7.98,-5.85 -5.32,-5.85
  text "1" at -2.082,0.777 h1.2
  text "4" at 3.88,0.652 h1.2
  text "2" at -2.27,-1.798 h1.2
  text "3" at 3.877,-1.892 h1.2
Mechanical 8:
  lines w0.05: -3.04,-3.81 -2.54,-3.81 ; -3.04,3.81 -2.54,3.81 ; -2.54,-4.31 -2.54,-3.81 ; -2.54,-3.31 -2.54,-3.81 ; -2.54,3.31 -2.54,3.81 ; -2.54,4.31 -2.54,3.81 ; -2.04,-3.81 -2.54,-3.81 ; -2.04,3.81 -2.54,3.81 ; -0.5,-1.27 0,-1.27 ; -0.5,0 0,0 ; -0.5,1.27 0,1.27 ; 0,-1.77 0,-1.27 ; 0,-0.77 0,-1.27 ; 0,-0.5 0,0 ; 0,0.5 0,0 ; 0,0.77 0,1.27 ; 0,1.77 0,1.27 ; 0.5,-1.27 0,-1.27 ; 0.5,0 0,0 ; 0.5,1.27 0,1.27 ; 2.04,-1.27 2.54,-1.27 ; 2.04,1.27 2.54,1.27 ; 2.54,-1.77 2.54,-1.27 ; 2.54,-0.77 2.54,-1.27 ; 2.54,0.77 2.54,1.27 ; 2.54,1.77 2.54,1.27 ; 3.04,-1.27 2.54,-1.27 ; 3.04,1.27 2.54,1.27 ; 4.58,-3.81 5.08,-3.81 ; 4.58,3.81 5.08,3.81 ; 5.08,-4.31 5.08,-3.81 ; 5.08,-3.31 5.08,-3.81 ; 5.08,3.31 5.08,3.81 ; 5.08,4.31 5.08,3.81 ; 5.58,-3.81 5.08,-3.81 ; 5.58,3.81 5.08,3.81
Mechanical 14:
  circle w0.1: c0,1.27 r0.4
  circle w0.1: c0,-1.27 r0.4
  circle w0.1: c-2.54,-3.81 r0.4
  circle w0.1: c5.08,-3.81 r0.4
  circle w0.1: c5.08,3.81 r0.4
  circle w0.1: c-2.54,3.81 r0.4
  lines w0.1: -1.32,-5.85 ccw(c-8.876,0) -1.32,5.85 ; 7.98,-4.5 19.28,-4.5 ; 7.98,4.5 19.28,4.5 ; 19.28,-4.5 19.68,-4.1 19.68,4.1 19.28,4.5 ; 19.28,-4.5 19.28,4.5 ; -5.32,-5.85 -5.32,5.85 7.98,5.85 7.98,-5.85 -5.32,-5.85
  text "1" at -2.082,0.777 h1.2
  text "4" at 3.88,0.652 h1.2
  text "2" at -2.27,-1.798 h1.2
  text "3" at 3.877,-1.892 h1.2
3D body "LEMO_EPL.0S.304.HLN.stp": height 12.7, standoff -4, extent -5.32,-5.85 19.68,5.85

## LEMO_EPL.1S.302.HLN [mm] "Elbow Socket (90°) With 1 Female + 1 Male Contacts For PCB, Serie 1S"
height 14
pads (6):
  round 1.6 hole 0.9: 1(-1.27,-1.27) 2(-1.27,1.27) 3(-3.81,-3.81) 3(-3.81,3.81) 3(3.81,-3.81) 3(3.81,3.81)
Top Overlay:
  lines w0.2: -2.132,-6.3 ccw(c-10.375,0) -0.354,-2.685 ; -2.132,6.3 cw(c-10.375,0) -0.387,2.804 ; 6.6,-5.5 19.9,-5.5 ; 6.6,5.5 19.9,5.5 ; 19.9,-5.5 20.4,-5 20.4,5 19.9,5.5 ; 19.9,-5.5 19.9,5.5 ; -6.6,-5.8 -6.1,-6.3 6.6,-6.3 6.6,6.3 -6.1,6.3 -6.6,5.8 -6.6,-5.8
  text "1" at -3.37,-1.87 h1.2
  text "2" at -3.57,0.67 h1.2
Mechanical 8:
  lines w0.1: -4.31,-3.81 -3.81,-3.81 ; -4.31,3.81 -3.81,3.81 ; -3.81,-4.31 -3.81,-3.81 ; -3.81,-3.31 -3.81,-3.81 ; -3.81,3.31 -3.81,3.81 ; -3.81,4.31 -3.81,3.81 ; -3.31,-3.81 -3.81,-3.81 ; -3.31,3.81 -3.81,3.81 ; -1.77,-1.27 -1.27,-1.27 ; -1.77,1.27 -1.27,1.27 ; -1.27,-1.77 -1.27,-1.27 ; -1.27,-0.77 -1.27,-1.27 ; -1.27,0.77 -1.27,1.27 ; -1.27,1.77 -1.27,1.27 ; -0.77,-1.27 -1.27,-1.27 ; -0.77,1.27 -1.27,1.27 ; -0.5,0 0,0 ; 0,-0.5 0,0 ; 0,0.5 0,0 ; 0.5,0 0,0 ; 3.31,-3.81 3.81,-3.81 ; 3.31,3.81 3.81,3.81 ; 3.81,-4.31 3.81,-3.81 ; 3.81,-3.31 3.81,-3.81 ; 3.81,3.31 3.81,3.81 ; 3.81,4.31 3.81,3.81 ; 4.31,-3.81 3.81,-3.81 ; 4.31,3.81 3.81,3.81
Mechanical 14:
  lines w0.1: -2.132,-6.3 ccw(c-10.375,0) -2.132,6.3 ; 6.6,-5.5 19.9,-5.5 ; 6.6,5.5 19.9,5.5 ; 19.9,-5.5 20.4,-5 20.4,5 19.9,5.5 ; 19.9,-5.5 19.9,5.5 ; -6.6,-5.8 -6.1,-6.3 6.6,-6.3 6.6,6.3 -6.1,6.3 -6.6,5.8 -6.6,-5.8
  text "1" at -3.37,-1.87 h1.2
  text "2" at -3.57,0.67 h1.2
3D body "LEMO_EPL.1S.302.HLN.stp": height 14, standoff -4, extent -6.6,-6.3 20.4,6.3

## LEMO_EPL.1S.304.HLN [mm] "Elbow Socket (90°) With 2 Female + 2 Male Contacts For PCB, Serie 1S"
height 14
pads (8):
  round 1.6 hole 0.9: 1(-1.27,1.27) 2(-1.27,-1.27) 3(1.27,-1.27) 4(1.27,1.27) 5(-3.81,-3.81) 5(-3.81,3.81) 5(3.81,-3.81) 5(3.81,3.81)
Top Overlay:
  lines w0.2: -2.132,-6.3 ccw(c-10.375,0) -0.169,-1.861 ; -2.132,6.3 cw(c-10.375,0) -0.169,1.861 ; 6.6,-5.5 19.9,-5.5 ; 6.6,5.5 19.9,5.5 ; 19.9,-5.5 19.9,5.5 ; 19.9,-5.5 20.4,-5 20.4,5 19.9,5.5 ; -6.6,-6.3 6.6,-6.3 6.6,6.3 -6.6,6.3 -6.6,-6.3
  text "3" at 2.677,-1.892 h1.2
  text "2" at -3.47,-1.798 h1.2
  text "4" at 2.68,0.652 h1.2
  text "1" at -3.282,0.777 h1.2
Mechanical 8:
  lines w0.1: -4.31,-3.81 -3.81,-3.81 ; -4.31,3.81 -3.81,3.81 ; -3.81,-4.31 -3.81,-3.81 ; -3.81,-3.31 -3.81,-3.81 ; -3.81,3.31 -3.81,3.81 ; -3.81,4.31 -3.81,3.81 ; -3.31,-3.81 -3.81,-3.81 ; -3.31,3.81 -3.81,3.81 ; -1.77,-1.27 -1.27,-1.27 ; -1.77,1.27 -1.27,1.27 ; -1.27,-1.77 -1.27,-1.27 ; -1.27,-0.77 -1.27,-1.27 ; -1.27,0.77 -1.27,1.27 ; -1.27,1.77 -1.27,1.27 ; -0.77,-1.27 -1.27,-1.27 ; -0.77,1.27 -1.27,1.27 ; -0.5,0 0,0 ; 0,-0.5 0,0 ; 0,0.5 0,0 ; 0.5,0 0,0 ; 0.77,-1.27 1.27,-1.27 ; 0.77,1.27 1.27,1.27 ; 1.27,-1.77 1.27,-1.27 ; 1.27,-0.77 1.27,-1.27 ; 1.27,0.77 1.27,1.27 ; 1.27,1.77 1.27,1.27 ; 1.77,-1.27 1.27,-1.27 ; 1.77,1.27 1.27,1.27 ; 3.31,-3.81 3.81,-3.81 ; 3.31,3.81 3.81,3.81 ; 3.81,-4.31 3.81,-3.81 ; 3.81,-3.31 3.81,-3.81 ; 3.81,3.31 3.81,3.81 ; 3.81,4.31 3.81,3.81 ; 4.31,-3.81 3.81,-3.81 ; 4.31,3.81 3.81,3.81
Mechanical 14:
  lines w0.1: -2.132,-6.3 ccw(c-10.375,0) -2.132,6.3 ; 6.6,-5.5 19.9,-5.5 ; 6.6,5.5 19.9,5.5 ; 19.9,-5.5 19.9,5.5 ; 19.9,-5.5 20.4,-5 20.4,5 19.9,5.5 ; -6.6,-6.3 6.6,-6.3 6.6,6.3 -6.6,6.3 -6.6,-6.3
  text "3" at 2.677,-1.892 h1.2
  text "2" at -3.47,-1.798 h1.2
  text "4" at 2.68,0.652 h1.2
  text "1" at -3.282,0.777 h1.2
3D body "LEMO_EPL.1S.304.HLN.stp": height 14, standoff -4, extent -6.6,-6.3 20.4,6.3

## LEMO_EPL.1S.305.HLN [mm] "Elbow Socket (90°) With 3 Female + 2 Male Contacts For PCB, Serie 1S"
height 14
pads (9):
  round 1.6 hole 0.9: 1(-3.81,-1.27) 2(-1.27,-1.27) 3(1.27,-1.27) 4(1.27,1.27) 5(-1.27,1.27) 6(-3.81,-3.81) 6(-3.81,3.81) 6(3.81,-3.81) 6(3.81,3.81)
Top Overlay:
  lines w0.2: -2.132,-6.3 ccw(c-10.375,0) -0.169,-1.861 ; -2.132,6.3 cw(c-10.375,0) -0.169,1.861 ; 6.6,-5.5 19.9,-5.5 ; 6.6,5.5 19.9,5.5 ; 19.9,-5.5 20.4,-5 20.4,5 19.9,5.5 ; 19.9,-5.5 19.9,5.5 ; -6.6,-6.3 -6.6,6.3 6.6,6.3 6.6,-6.3 -6.6,-6.3
  text "5" at -3.407,0.852 h1.2
  text "4" at 2.605,0.727 h1.2
  text "1" at -5.695,-1.748 h1.2
  text "3" at 2.602,-1.817 h1.2
Mechanical 8:
  lines w0.1: -4.31,-3.81 -3.81,-3.81 ; -4.31,3.81 -3.81,3.81 ; -3.81,-4.31 -3.81,-3.81 ; -3.81,-3.31 -3.81,-3.81 ; -3.81,3.31 -3.81,3.81 ; -3.81,4.31 -3.81,3.81 ; -3.31,-3.81 -3.81,-3.81 ; -3.31,3.81 -3.81,3.81 ; -1.77,-1.27 -1.27,-1.27 ; -1.77,1.27 -1.27,1.27 ; -1.27,-1.77 -1.27,-1.27 ; -1.27,-0.77 -1.27,-1.27 ; -1.27,0.77 -1.27,1.27 ; -1.27,1.77 -1.27,1.27 ; -0.77,-1.27 -1.27,-1.27 ; -0.77,1.27 -1.27,1.27 ; -0.5,0 0,0 ; 0,-0.5 0,0 ; 0,0.5 0,0 ; 0.5,0 0,0 ; 0.77,-1.27 1.27,-1.27 ; 0.77,1.27 1.27,1.27 ; 1.27,-1.77 1.27,-1.27 ; 1.27,-0.77 1.27,-1.27 ; 1.27,0.77 1.27,1.27 ; 1.27,1.77 1.27,1.27 ; 1.77,-1.27 1.27,-1.27 ; 1.77,1.27 1.27,1.27 ; 3.31,-3.81 3.81,-3.81 ; 3.31,3.81 3.81,3.81 ; 3.81,-4.31 3.81,-3.81 ; 3.81,-3.31 3.81,-3.81 ; 3.81,3.31 3.81,3.81 ; 3.81,4.31 3.81,3.81 ; 4.31,-3.81 3.81,-3.81 ; 4.31,3.81 3.81,3.81
Mechanical 14:
  lines w0.1: -2.132,-6.3 ccw(c-10.375,0) -2.132,6.3 ; 6.6,-5.5 19.9,-5.5 ; 6.6,5.5 19.9,5.5 ; 19.9,-5.5 20.4,-5 20.4,5 19.9,5.5 ; 19.9,-5.5 19.9,5.5 ; -6.6,-6.3 -6.6,6.3 6.6,6.3 6.6,-6.3 -6.6,-6.3
  text "5" at -3.407,0.852 h1.2
  text "4" at 2.605,0.727 h1.2
  text "1" at -5.695,-1.748 h1.2
  text "3" at 2.602,-1.817 h1.2
3D body "LEMO_EPL.1S.305.HLN.stp": height 14, standoff -4, extent -6.6,-6.3 20.4,6.3

## LEMO_EPL.1S.306.HLN [mm] "Elbow Socket (90°) With 3 Female + 3 Male Contacts For PCB, Serie 1S"
height 14
pads (10):
  round 1.6 hole 0.9: 1(-3.81,-1.27) 2(-1.27,-1.27) 3(1.27,-1.27) 4(1.27,1.27) 5(-1.27,1.27) 6(-3.81,1.27) 7(-3.81,-3.81) 7(-3.81,3.81) 7(3.81,-3.81) 7(3.81,3.81)
Top Overlay:
  lines w0.2: -2.132,-6.3 ccw(c-10.375,0) -0.169,-1.861 ; -2.132,6.3 cw(c-10.375,0) -0.169,1.861 ; 6.6,-5.5 19.9,-5.5 ; 6.6,5.5 19.9,5.5 ; 19.9,-5.5 19.9,5.5 ; 19.9,-5.5 20.4,-5 20.4,5 19.9,5.5 ; -6.6,-6.3 6.6,-6.3 6.6,6.3 -6.6,6.3 -6.6,-6.3
  text "6" at -5.947,0.852 h1.2
  text "3" at 2.602,-1.817 h1.2
  text "1" at -5.695,-1.748 h1.2
  text "4" at 2.605,0.727 h1.2
Mechanical 8:
  lines w0.1: -4.31,-3.81 -3.81,-3.81 ; -4.31,1.27 -3.81,1.27 ; -4.31,3.81 -3.81,3.81 ; -3.81,-4.31 -3.81,-3.81 ; -3.81,-3.31 -3.81,-3.81 ; -3.81,0.77 -3.81,1.27 ; -3.81,1.77 -3.81,1.27 ; -3.81,3.31 -3.81,3.81 ; -3.81,4.31 -3.81,3.81 ; -3.31,-3.81 -3.81,-3.81 ; -3.31,1.27 -3.81,1.27 ; -3.31,3.81 -3.81,3.81 ; -1.77,-1.27 -1.27,-1.27 ; -1.77,1.27 -1.27,1.27 ; -1.27,-1.77 -1.27,-1.27 ; -1.27,-0.77 -1.27,-1.27 ; -1.27,0.77 -1.27,1.27 ; -1.27,1.77 -1.27,1.27 ; -0.77,-1.27 -1.27,-1.27 ; -0.77,1.27 -1.27,1.27 ; -0.5,0 0,0 ; 0,-0.5 0,0 ; 0,0.5 0,0 ; 0.5,0 0,0 ; 0.77,-1.27 1.27,-1.27 ; 0.77,1.27 1.27,1.27 ; 1.27,-1.77 1.27,-1.27 ; 1.27,-0.77 1.27,-1.27 ; 1.27,0.77 1.27,1.27 ; 1.27,1.77 1.27,1.27 ; 1.77,-1.27 1.27,-1.27 ; 1.77,1.27 1.27,1.27 ; 3.31,-3.81 3.81,-3.81 ; 3.31,3.81 3.81,3.81 ; 3.81,-4.31 3.81,-3.81 ; 3.81,-3.31 3.81,-3.81 ; 3.81,3.31 3.81,3.81 ; 3.81,4.31 3.81,3.81 ; 4.31,-3.81 3.81,-3.81 ; 4.31,3.81 3.81,3.81
Mechanical 14:
  lines w0.1: -2.132,-6.3 ccw(c-10.375,0) -2.132,6.3 ; 6.6,-5.5 19.9,-5.5 ; 6.6,5.5 19.9,5.5 ; 19.9,-5.5 19.9,5.5 ; 19.9,-5.5 20.4,-5 20.4,5 19.9,5.5 ; -6.6,-6.3 6.6,-6.3 6.6,6.3 -6.6,6.3 -6.6,-6.3
  text "6" at -5.947,0.852 h1.2
  text "3" at 2.602,-1.817 h1.2
  text "1" at -5.695,-1.748 h1.2
  text "4" at 2.605,0.727 h1.2
3D body "LEMO_EPL.1S.306.HLN.stp": height 14, standoff -4, extent -6.6,-6.3 20.4,6.3